# Altium footprint library 28Pins_Project_V1I1.PcbLib: 30 footprints (part 2 of 2)
Each footprint in its own frame and in the unit in brackets; x right, y up, seen from the top. Pads: shape width x height; smd on the part's side, far side on the other; paste and mask are expansions set on the pad; w line width, h text height; cw(c..) or ccw(c..) is an arc to the next point about the centre after c.
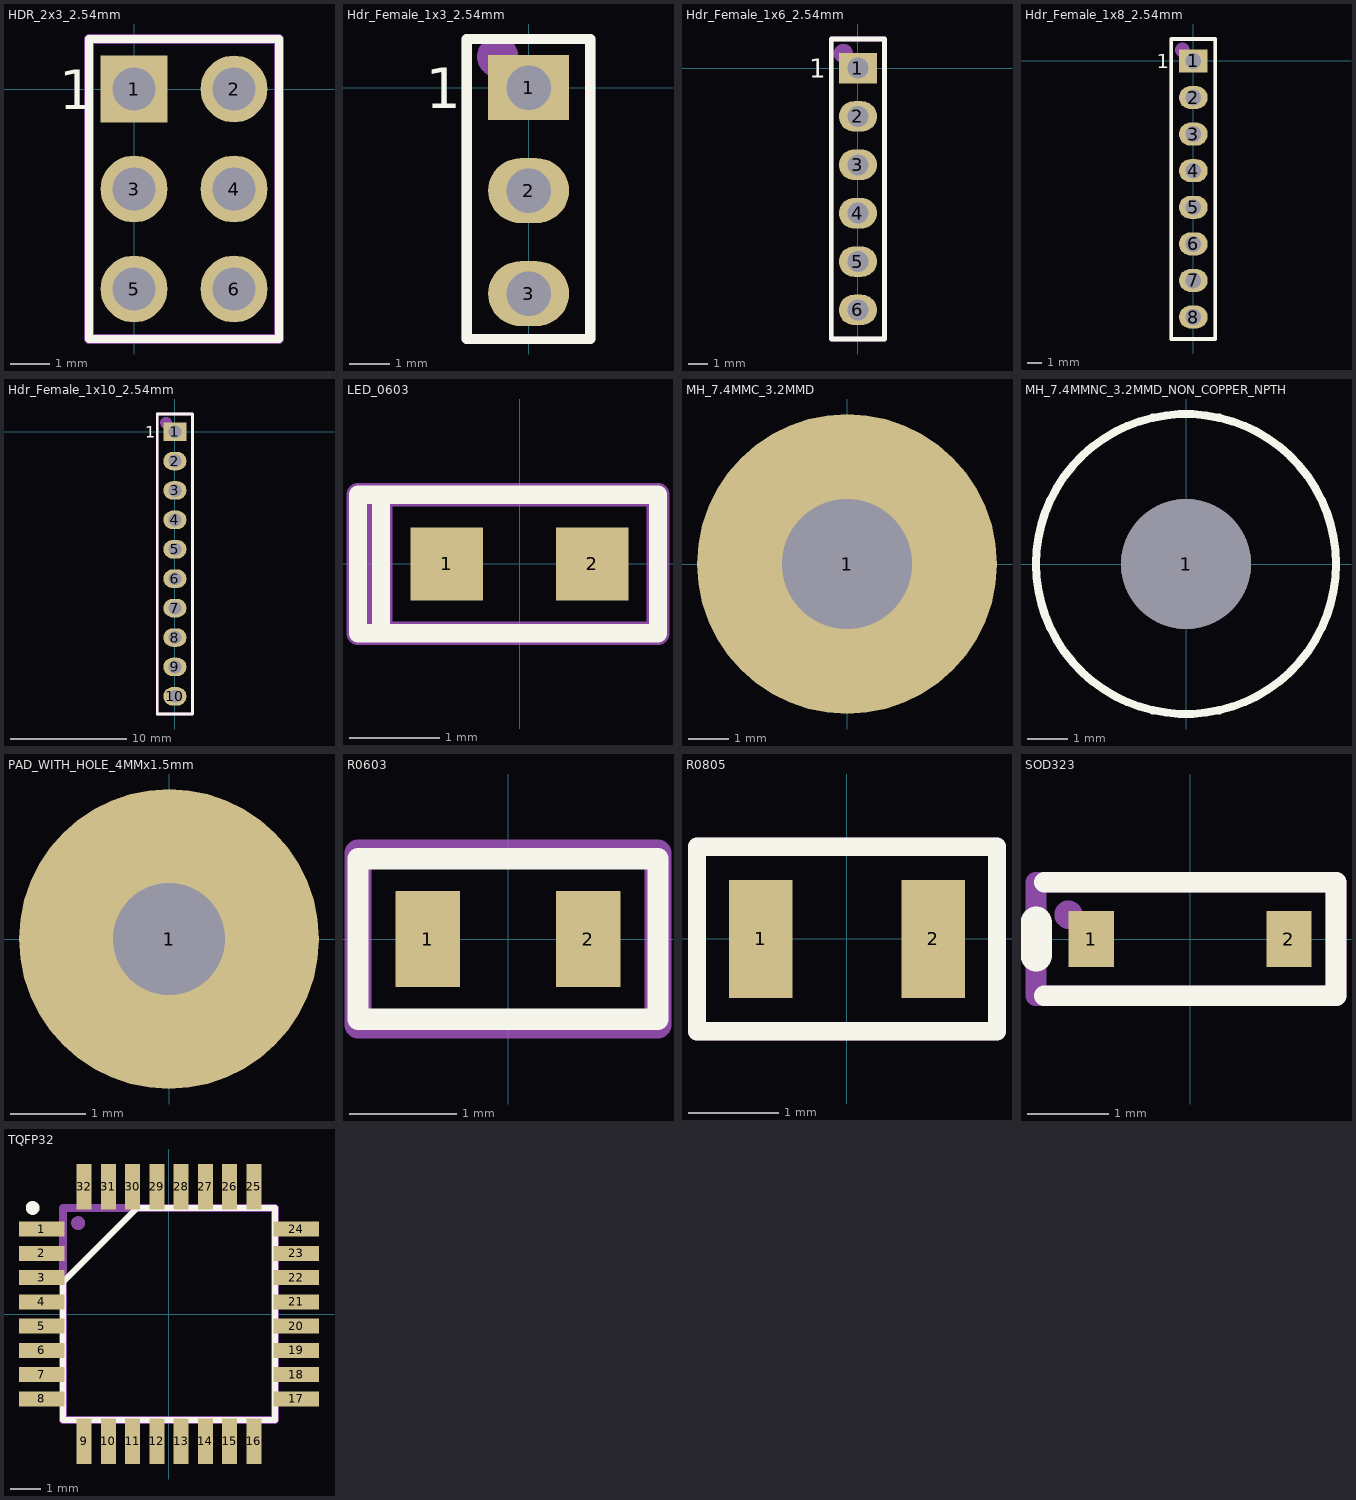
[diagram p1: the footprints below, top view; thin cyan lines are the x and y axes]

## HDR_2x3_2.54mm [mm]
pads (6):
  rect 1.7x1.7 hole 1.1: 1(0,0)
  round 1.7 hole 1.1: 2(2.54,0) 3(0,-2.54) 4(2.54,-2.54) 5(0,-5.08) 6(2.54,-5.08)
Top Overlay:
  lines w0.2: -1.143,-6.35 3.683,-6.35 3.683,1.27 -1.143,1.27 -1.143,-6.35
  text "1" at -1.905,-0.508 h1
Mechanical 29:
  circle w0.508: c0,0 r0.284
  lines w0.254: -1.143,-6.35 -1.143,1.27 3.683,1.27 3.683,-6.35 -1.143,-6.35
  text ".Designator" at 1.016,-5.207 h0.76
3D body "User Library-Header3x2_100_TH.STEP": height 8.45, standoff -2.53, extent -1.27,-6.345 3.81,1.275

## Hdr_Female_1x3_2.54mm [mm]
pads (3):
  rect 2x1.6 hole 1.1: 1(0,0)
  oval 2x1.6 hole 1.1: 2(0,-2.54) 3(0,-5.08)
Top Overlay:
  lines w0.254: -1.524,-6.2 -1.524,1.2 1.524,1.2 1.524,-6.2 -1.524,-6.2
  text "1" at -2.54,-0.508 h1
Mechanical 29:
  circle w0.508: c-0.762,0.762 r0.254
  lines w0.254: -1.524,-6.2 -1.524,1.2 1.524,1.2 1.524,-6.2 -1.524,-6.2
  text ".Designator" at 0.707,-5.746 h1.02
3D body "HDR_1x3_White.stp": height 8.19, standoff -3.31, extent -1.31,-6.11 1.1,1.11

## Hdr_Female_1x6_2.54mm [mm]
pads (6):
  rect 2x1.6 hole 1.1: 1(0,0)
  oval 2x1.6 hole 1.1: 2(0,-2.54) 3(0,-5.08) 4(0,-7.62) 5(0,-10.16) 6(0,-12.7)
Top Overlay:
  lines w0.254: -1.4,-14.224 -1.4,1.524 1.4,1.524 1.4,-14.224 -1.4,-14.224
  text "1" at -2.54,-0.508 h1
Mechanical 29:
  circle w0.508: c-0.762,0.762 r0.254
  lines w0.254: -1.4,-14.224 -1.4,1.524 1.4,1.524 1.4,-14.224 -1.4,-14.224
  text ".Designator" at 0.17,-12.7 h1.02
3D body "m20-7820646.stp": height 8.51, standoff -2.99, extent -1.25,-14.17 1.25,1.47

## Hdr_Female_1x8_2.54mm [mm]
pads (8):
  rect 2x1.6 hole 1.1: 1(0,0)
  oval 2x1.6 hole 1.1: 2(0,-2.54) 3(0,-5.08) 4(0,-7.62) 5(0,-10.16) 6(0,-12.7) 7(0,-15.24) 8(0,-17.78)
Top Overlay:
  lines w0.254: -1.524,-19.304 0,-19.304 1.524,-19.304 1.524,1.524 -1.524,1.524 -1.524,-19.304
  text "1" at -2.54,-0.508 h1
Mechanical 29:
  circle w0.508: c-0.762,0.762 r0.254
  lines w0.254: -1.524,-19.304 -1.524,1.524 1.524,1.524 1.524,-19.304 -1.524,-19.304
  text ".Designator" at 0.508,-17.526 h1.52
3D body "m20-7820842.stp": height 8.51, standoff -2.99, extent -1.25,-19.25 1.25,1.47

## Hdr_Female_1x10_2.54mm [mm]
pads (10):
  rect 2x1.6 hole 1.1: 1(0,0)
  oval 2x1.6 hole 1.1: 2(0,-2.54) 3(0,-5.08) 4(0,-7.62) 5(0,-10.16) 6(0,-12.7) 7(0,-15.24) 8(0,-17.78) 9(0,-20.32) 10(0,-22.86)
Top Overlay:
  lines w0.254: -1.524,-24.384 -1.524,1.524 1.524,1.524 1.524,-24.384 -1.27,-24.384 -1.524,-24.384
  text "1" at -2.54,-0.508 h1
Mechanical 29:
  circle w0.508: c-0.762,0.762 r0.254
  lines w0.254: -1.524,-24.384 -1.524,1.524 1.524,1.524 1.524,-24.384 -1.524,-24.384
  text ".Designator" at 0.508,-21.844 h1.52
3D body "m20-7821046.stp": height 8.51, standoff -2.99, extent -1.23,-24.33 1.27,1.47

## LED_0603 [mm]
pads (2):
  rect 0.8x0.8 smd: 1(-0.8,0) 2(0.8,0)
Top Overlay:
  lines w0.2: -1.524,-0.762 -1.778,-0.762 -1.778,0.762 -1.524,0.762 ; -1.524,-0.762 -1.524,0.762 ; -1.524,-0.762 1.524,-0.762 1.524,0.762 -1.524,0.762
Mechanical 29:
  lines w0.254: -1.524,-0.762 -1.524,0.762 ; -1.778,-0.762 -1.778,0.762 1.524,0.762 1.524,-0.762 -1.778,-0.762
  text ".Designator" at -0.916,-0.208 h0.6
3D body: height 0.8, standoff 0.5, extent -0.15,-0.157 0.15,0.157
3D body "User Library-LED SMD0603.step": height 0.68, standoff 0, extent -0.825,-0.35 0.825,0.375

## MH_7.4MMC_3.2MMD [mm]
pads (1):
  round 7.4 hole 3.2: 1(0,0)

## MH_7.4MMNC_3.2MMD_NON_COPPER_NPTH [mm]
pads (1):
  round 3.2 hole 3.2 unplated: 1(0,0)
Top Overlay:
  circle w0.2: c0,0 r3.7

## PAD_WITH_HOLE_4MMx1.5mm [mm]
pads (1):
  round 4 hole 1.5 paste-2539.97: 1(0,0)

## PCBComponent_1 [mm]

## R0603 [mm]
pads (2):
  rect 0.6x0.9 smd: 1(-0.75,0) 2(0.75,0)
Top Overlay:
  lines w0.2: -1.4,-0.75 -1.4,0.75 1.4,0.75 1.4,-0.75 -1.4,-0.75
Mechanical 29:
  lines w0.254: -1.4,-0.8 1.4,-0.8 1.4,0.8 -1.4,0.8 -1.4,-0.8
  text ".Designator" at -0.6,-0.233 h0.5
3D body "R0603.step": height 0.81, standoff 0.01, extent -0.8,-0.44 0.8,0.4

## R0805 [mm]
pads (2):
  rect 0.7x1.3 smd: 1(-0.95,0) 2(0.95,0)
Top Overlay:
  lines w0.2: -1.651,-1.016 1.651,-1.016 1.651,1.016 -1.651,1.016 -1.651,-1.016
Mechanical 29:
  lines w0.2: -1.651,-1.016 -1.651,1.016 1.651,1.016 1.651,-1.016 -1.651,-1.016
  text ".Designator" at -2.743,-1.685 h0.51
3D body "User Library-Chip Resistor2 (1).step": height 0.71, standoff 0.01, extent -1,-0.6 1,0.6

## SOD323 [mil]
pads (2):
  rect 22x27 smd: 1(-48,0) 2(48,0)
Top Overlay:
  lines w10: -70.87,-27.56 70.87,-27.56 70.87,27.56 -70.87,27.56
  lines w15.75: -74.8,-7.87 -74.8,7.87
Mechanical 29:
  circle w10: c-59.06,11.81 r1.87
  lines w10: -74.8,-27.56 70.87,-27.56 70.87,27.56 -74.8,27.56 -74.8,-27.56
3D body "User Library-SOD323.step": height 39.48, standoff 0.5, extent -49.21,-25.59 49.21,23.62

## TQFP32 [mm]
pads (32):
  rect 1.5x0.5 smd: 1(-4.2,2.8) 2(-4.2,2) 3(-4.2,1.2) 4(-4.2,0.4) 5(-4.2,-0.4) 6(-4.2,-1.2) 7(-4.2,-2) 8(-4.2,-2.8) 17(4.2,-2.8) 18(4.2,-2) 19(4.2,-1.2) 20(4.2,-0.4) 21(4.2,0.4) 22(4.2,1.2) 23(4.2,2) 24(4.2,2.8)
  rect 0.5x1.5 smd: 9(-2.8,-4.2) 10(-2,-4.2) 11(-1.2,-4.2) 12(-0.4,-4.2) 13(0.4,-4.2) 14(1.2,-4.2) 15(2,-4.2) 16(2.8,-4.2) 25(2.8,4.2) 26(2,4.2) 27(1.2,4.2) 28(0.4,4.2) 29(-0.4,4.2) 30(-1.2,4.2) 31(-2,4.2) 32(-2.8,4.2)
Top Overlay:
  circle w0.254: c-4.5,3.5 r0.1
  lines w0.2: -3.5,-3.5 -3.5,1.045 -1.045,3.5 3.5,3.5 3.5,-3.5 -3.5,-3.5
Mechanical 29:
  circle w0.254: c-3,3 r0.1
  lines w0.254: -1,3.5 -1.1,3.5 ; -1.1,3.5 -3.5,3.5 -3.5,-3.5 3.5,-3.5 3.5,3.5 -1.1,3.5
  text ".Designator" at -2.346,-0.938 h1.52
3D body "User Library-tqfp32.step": height 1.2, standoff 0, extent -4.599,-4.6 4.599,4.599